# Altium footprint library NXP_60_26022015.PCBLIB: 287 footprints (part 4 of 18)
Each footprint in its own frame and in the unit in brackets; x right, y up, seen from the top. Pads: shape width x height; smd on the part's side, far side on the other; paste and mask are expansions set on the pad; w line width, h text height; cw(c..) or ccw(c..) is an arc to the next point about the centre after c.
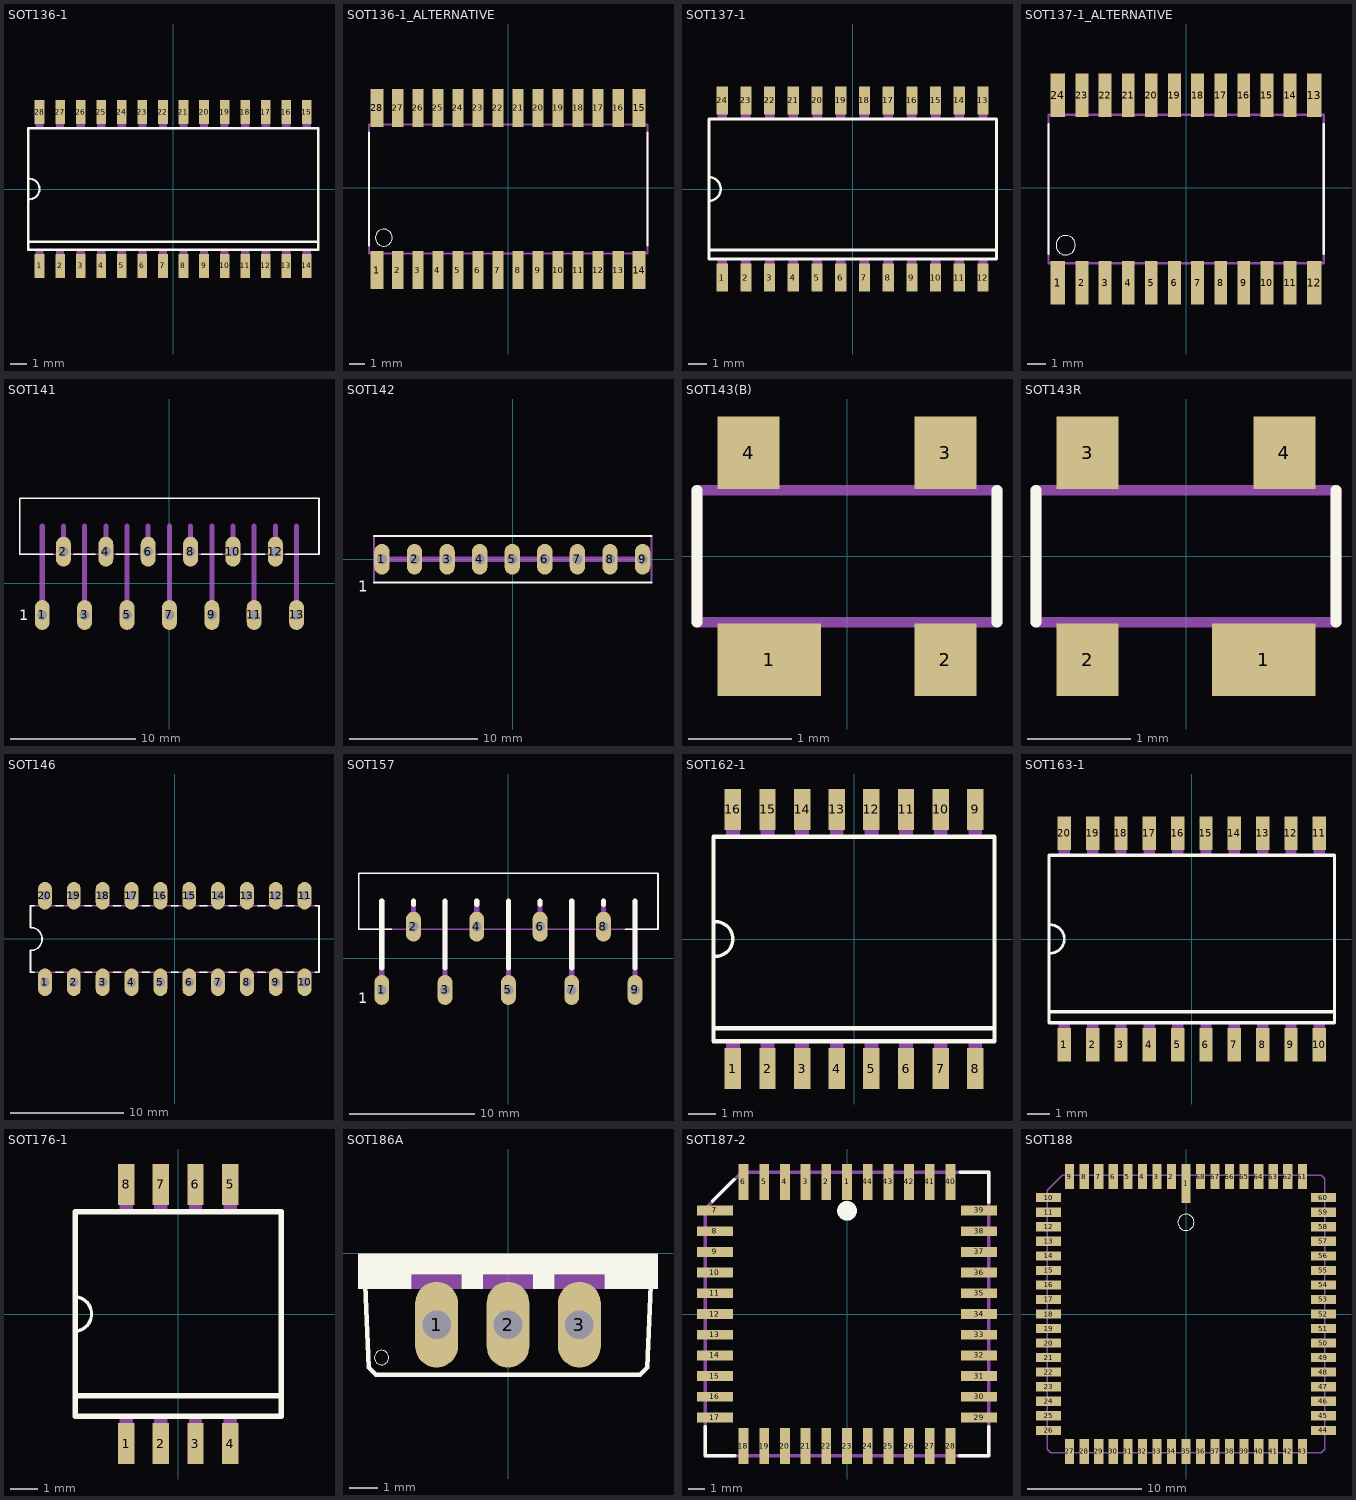
[diagram p3: the footprints below, top view; thin cyan lines are the x and y axes]

## SOT136-1 [mm]
pads (28):
  rect 0.6x1.5 smd: 1(-8.255,-4.75) 2(-6.985,-4.75) 3(-5.715,-4.75) 4(-4.445,-4.75) 5(-3.175,-4.75) 6(-1.905,-4.75) 7(-0.635,-4.75) 8(0.635,-4.75) 9(1.905,-4.75) 10(3.175,-4.75) 11(4.445,-4.75) 12(5.715,-4.75) 13(6.985,-4.75) 14(8.255,-4.75) 15(8.255,4.75) 16(6.985,4.75) 17(5.715,4.75) 18(4.445,4.75) 19(3.175,4.75) 20(1.905,4.75) 21(0.635,4.75) 22(-0.635,4.75) 23(-1.905,4.75) 24(-3.175,4.75) 25(-4.445,4.75) 26(-5.715,4.75) 27(-6.985,4.75) 28(-8.255,4.75)
Top Overlay:
  lines w0.127: -8.89,-0.635 ccw(c-8.89,0) -8.89,0.635
  lines w0.152: -8.95,-3.27 -8.95,3.75 8.95,3.75 8.95,-3.27 ; -8.95,-3.27 -8.95,-3.75 8.95,-3.75 8.95,-3.27 ; -8.95,-3.27 8.95,-3.27
Mechanical 16:
  rectangle: -0.889,3.75 -0.381,4.75
  rectangle: -2.159,3.75 -1.651,4.75
  rectangle: -3.429,3.75 -2.921,4.75
  rectangle: -4.699,3.75 -4.191,4.75
  rectangle: 0.381,3.75 0.889,4.75
  rectangle: 1.651,3.75 2.159,4.75
  rectangle: 2.921,3.75 3.429,4.75
  rectangle: 4.191,3.75 4.699,4.75
  rectangle: -0.889,-4.75 -0.381,-3.75
  rectangle: -2.159,-4.75 -1.651,-3.75
  rectangle: -3.429,-4.75 -2.921,-3.75
  rectangle: -4.699,-4.75 -4.191,-3.75
  rectangle: 0.381,-4.75 0.889,-3.75
  rectangle: 1.651,-4.75 2.159,-3.75
  rectangle: 2.921,-4.75 3.429,-3.75
  rectangle: 4.191,-4.75 4.699,-3.75
  rectangle: 5.461,3.75 5.969,4.75
  rectangle: -5.969,3.75 -5.461,4.75
  rectangle: 5.461,-4.75 5.969,-3.75
  rectangle: -5.969,-4.75 -5.461,-3.75
  rectangle: -7.239,3.75 -6.731,4.75
  rectangle: -8.509,3.75 -8.001,4.75
  rectangle: -7.239,-4.75 -6.731,-3.75
  rectangle: -8.509,-4.75 -8.001,-3.75
  rectangle: 6.731,-4.75 7.239,-3.75
  rectangle: 8.001,-4.75 8.509,-3.75
  rectangle: 6.731,3.75 7.239,4.75
  rectangle: 8.001,3.75 8.509,4.75

## SOT136-1_ALTERNATIVE [mil]
pads (28):
  rect 31.5x94.49 smd: 1(-326.97,-205) 14(326.97,-205) 15(326.97,200) 28(-326.97,200)
  rect 27.56x94.49 smd: 2(-275,-205) 3(-225,-205) 4(-175,-205) 5(-125,-205) 6(-75,-205) 7(-25,-205) 8(25,-205) 9(75,-205) 10(125,-205) 11(175,-205) 12(225,-205) 13(275,-205) 16(275,200) 17(225,200) 18(175,200) 19(125,200) 20(75,200) 21(25,200) 22(-25,200) 23(-75,200) 24(-125,200) 25(-175,200) 26(-225,200) 27(-275,200)
Top Overlay:
  circle w0: c-310,-124 r21
  lines w5: -347,-143 -347,138 ; 348,-143 348,138
Mechanical 16:
  rectangle: -335,-224 -315,-164
  rectangle: -285,-224 -265,-164
  rectangle: -235,-224 -215,-164
  rectangle: -185,-224 -165,-164
  rectangle: -135,-224 -115,-164
  rectangle: -85,-224 -65,-164
  rectangle: -35,-224 -15,-164
  rectangle: 15,-224 35,-164
  rectangle: 65,-224 85,-164
  rectangle: 115,-224 135,-164
  rectangle: 165,-224 185,-164
  rectangle: 215,-224 235,-164
  rectangle: 265,-224 285,-164
  rectangle: 315,-224 335,-164
  rectangle: 315,159 335,219
  rectangle: 265,159 285,219
  rectangle: 215,159 235,219
  rectangle: 165,159 185,219
  rectangle: 115,159 135,219
  rectangle: 65,159 85,219
  rectangle: 15,159 35,219
  rectangle: -35,159 -15,219
  rectangle: -85,159 -65,219
  rectangle: -135,159 -115,219
  rectangle: -185,159 -165,219
  rectangle: -235,159 -215,219
  rectangle: -285,159 -265,219
  rectangle: -335,159 -315,219
  lines w5: -347,-163 348,-163 348,158 -347,158 -347,-163

## SOT137-1 [mm]
pads (24):
  rect 0.6x1.5 smd: 1(-6.985,-4.75) 2(-5.715,-4.75) 3(-4.445,-4.75) 4(-3.175,-4.75) 5(-1.905,-4.75) 6(-0.635,-4.75) 7(0.635,-4.75) 8(1.905,-4.75) 9(3.175,-4.75) 10(4.445,-4.75) 11(5.715,-4.75) 12(6.985,-4.75) 13(6.985,4.75) 14(5.715,4.75) 15(4.445,4.75) 16(3.175,4.75) 17(1.905,4.75) 18(0.635,4.75) 19(-0.635,4.75) 20(-1.905,4.75) 21(-3.175,4.75) 22(-4.445,4.75) 23(-5.715,4.75) 24(-6.985,4.75)
Top Overlay:
  lines w0.127: -7.7,-0.635 ccw(c-7.7,0) -7.7,0.635
  lines w0.152: -7.7,-3.27 -7.7,-0.635 -7.7,0.635 -7.7,3.75 7.7,3.75 7.7,-3.27 ; -7.7,-3.27 -7.7,-3.75 7.7,-3.75 7.7,-3.27 ; -7.7,-3.27 7.7,-3.27
Mechanical 16:
  rectangle: -0.889,3.75 -0.381,4.75
  rectangle: -2.159,3.75 -1.651,4.75
  rectangle: -3.429,3.75 -2.921,4.75
  rectangle: -4.699,3.75 -4.191,4.75
  rectangle: 0.381,3.75 0.889,4.75
  rectangle: 1.651,3.75 2.159,4.75
  rectangle: 2.921,3.75 3.429,4.75
  rectangle: 4.191,3.75 4.699,4.75
  rectangle: -0.889,-4.75 -0.381,-3.75
  rectangle: -2.159,-4.75 -1.651,-3.75
  rectangle: -3.429,-4.75 -2.921,-3.75
  rectangle: -4.699,-4.75 -4.191,-3.75
  rectangle: 0.381,-4.75 0.889,-3.75
  rectangle: 1.651,-4.75 2.159,-3.75
  rectangle: 2.921,-4.75 3.429,-3.75
  rectangle: 4.191,-4.75 4.699,-3.75
  rectangle: 5.461,3.75 5.969,4.75
  rectangle: -5.969,3.75 -5.461,4.75
  rectangle: 5.461,-4.75 5.969,-3.75
  rectangle: -5.969,-4.75 -5.461,-3.75
  rectangle: -7.239,3.75 -6.731,4.75
  rectangle: -7.239,-4.75 -6.731,-3.75
  rectangle: 6.731,-4.75 7.239,-3.75
  rectangle: 6.731,3.75 7.239,4.75

## SOT137-1_ALTERNATIVE [mil]
pads (24):
  rect 31.5x94.49 smd: 1(-276.97,-205) 12(276.97,-205) 13(276.97,200) 24(-276.97,200)
  rect 27.56x94.49 smd: 2(-225,-205) 3(-175,-205) 4(-125,-205) 5(-75,-205) 6(-25,-205) 7(25,-205) 8(75,-205) 9(125,-205) 10(175,-205) 11(225,-205) 14(225,200) 15(175,200) 16(125,200) 17(75,200) 18(25,200) 19(-25,200) 20(-75,200) 21(-125,200) 22(-175,200) 23(-225,200)
Top Overlay:
  circle w0: c-260,-124 r21
  lines w5: -297,-143 -297,138 ; 298,-143 298,138
Mechanical 16:
  rectangle: -285,-224 -265,-164
  rectangle: -235,-224 -215,-164
  rectangle: -185,-224 -165,-164
  rectangle: -135,-224 -115,-164
  rectangle: -85,-224 -65,-164
  rectangle: -35,-224 -15,-164
  rectangle: 15,-224 35,-164
  rectangle: 65,-224 85,-164
  rectangle: 115,-224 135,-164
  rectangle: 165,-224 185,-164
  rectangle: 215,-224 235,-164
  rectangle: 265,-224 285,-164
  rectangle: 265,159 285,219
  rectangle: 215,159 235,219
  rectangle: 165,159 185,219
  rectangle: 115,159 135,219
  rectangle: 65,159 85,219
  rectangle: 15,159 35,219
  rectangle: -35,159 -15,219
  rectangle: -85,159 -65,219
  rectangle: -135,159 -115,219
  rectangle: -185,159 -165,219
  rectangle: -235,159 -215,219
  rectangle: -285,159 -265,219
  lines w5: -297,-163 298,-163 298,158 -297,158 -297,-163

## SOT141 [mil]
pads (13):
  oval 47.25x94.5 hole 31.5: 1(-401.57,-100) 2(-334.65,100) 3(-267.72,-100) 4(-200.79,100) 5(-133.86,-100) 6(-66.93,100) 7(0,-100) 8(66.93,100) 9(133.86,-100) 10(200.79,100) 11(267.72,-100) 12(334.65,100) 13(401.57,-100)
Top Overlay:
  lines w5: -368.11,92.13 -472.44,92.13 -472.44,269.29 472.44,269.29 472.44,92.13 368.11,92.13 ; -301.18,92.13 -234.25,92.13 ; -167.32,92.13 -100.39,92.13 ; -33.46,92.13 33.46,92.13 ; 100.39,92.13 167.32,92.13 ; 234.25,92.13 301.18,92.13
  text "1" at -475,-116.93 h33.46
Mechanical 16:
  lines w5: -472.44,92.13 472.44,92.13
  lines w16: -401.57,-100 -401.57,180.71 ; -334.65,100 -334.65,180.71 ; -267.72,-100 -267.72,180.71 ; -200.79,100 -200.79,180.71 ; -133.86,-100 -133.86,180.71 ; -66.93,100 -66.93,180.71 ; 0,-100 0,180.71 ; 66.93,100 66.93,180.71 ; 133.86,-100 133.86,180.71 ; 200.79,100 200.79,180.71 ; 267.72,-100 267.72,180.71 ; 334.65,100 334.65,180.71 ; 401.57,-100 401.57,180.71

## SOT142 [mil]
pads (9):
  oval 47.25x94.5 hole 31.5: 1(-401.57,0) 2(-301.57,0) 3(-201.57,0) 4(-101.57,0) 5(-1.57,0) 6(98.43,0) 7(198.43,0) 8(298.43,0) 9(398.43,0)
Top Overlay:
  lines w6: -425.2,-70.87 425.2,-70.87 ; -425.2,70.87 425.2,70.87
  text "1" at -475,-100 h33.46
Mechanical 16:
  lines w6: -425.2,-70.87 -425.2,70.87 ; 425.2,-70.87 425.2,70.87
  lines w16.54: -413.39,0 413.39,0

## SOT143(B) [mm]
pads (4):
  rect 1x0.7 smd: 1(-0.75,-1)
  rect 0.6x0.7 smd: 2(0.95,-1) 3(0.95,1) 4(-0.95,1)
Top Overlay:
  lines w0.102: -1.448,-0.635 -1.448,0.635 ; 1.448,-0.635 1.448,0.635
Mechanical 16:
  rectangle: 0.721,-1.293 1.179,-0.607
  rectangle: 0.721,0.607 1.179,1.293
  rectangle: -1.179,0.607 -0.721,1.293
  rectangle: -1.194,-1.321 -0.305,-0.635
  lines w0.102: -1.448,-0.635 1.448,-0.635 1.448,0.635 -1.448,0.635 -1.448,-0.635

## SOT143R [mm]
pads (4):
  rect 1x0.7 smd: 1(0.75,-1)
  rect 0.6x0.7 smd: 2(-0.95,-1) 3(-0.95,1) 4(0.95,1)
Top Overlay:
  lines w0.102: -1.448,-0.635 -1.448,0.635 ; 1.448,-0.635 1.448,0.635
Mechanical 16:
  rectangle: -1.179,-1.293 -0.721,-0.607
  rectangle: 0.721,0.607 1.179,1.293
  rectangle: -1.179,0.607 -0.721,1.293
  rectangle: 0.306,-1.321 1.195,-0.635
  lines w0.102: -1.448,-0.635 1.448,-0.635 1.448,0.635 -1.448,0.635 -1.448,-0.635

## SOT146 [mil]
pads (20):
  oval 48x96 hole 32: 1(-450,-150) 2(-350,-150) 3(-250,-150) 4(-150,-150) 5(-50,-150) 6(50,-150) 7(150,-150) 8(250,-150) 9(350,-150) 10(450,-150) 11(450,150) 12(350,150) 13(250,150) 14(150,150) 15(50,150) 16(-50,150) 17(-150,150) 18(-250,150) 19(-350,150) 20(-450,150)
Top Overlay:
  lines w6: -487.5,-115 -500,-115 -500,-40 ccw(c-500,0) -500,40 -500,115 -487.5,115 ; -412.5,-115 -387.5,-115 ; -412.5,115 -387.5,115 ; -312.5,-115 -287.5,-115 ; -312.5,115 -287.5,115 ; -212.5,-115 -187.5,-115 ; -212.5,115 -187.5,115 ; -112.5,-115 -87.5,-115 ; -112.5,115 -87.5,115 ; -12.5,-115 12.5,-115 ; -12.5,115 12.5,115 ; 87.5,-115 112.5,-115 ; 87.5,115 112.5,115 ; 187.5,-115 212.5,-115 ; 187.5,115 212.5,115 ; 287.5,-115 312.5,-115 ; 287.5,115 312.5,115 ; 387.5,-115 412.5,-115 ; 387.5,115 412.5,115 ; 487.5,-115 500,-115 500,115 487.5,115
Mechanical 16:
  lines w6: -500,-115 500,-115 ; -500,115 500,115

## SOT157 [mil]
pads (9):
  oval 47.25x94.5 hole 31.5: 1(-400,-100) 2(-300,100) 3(-200,-100) 4(-100,100) 5(0,-100) 6(100,100) 7(200,-100) 8(300,100) 9(400,-100)
Top Overlay:
  lines w5: -368.5,92.13 -472.44,92.13 -472.44,269.29 472.44,269.29 472.44,92.13 368.5,92.13
  lines w16: -400,-30 -400,180.71 ; -300,170 -300,180.71 ; -200,-30 -200,180.71 ; -100,170 -100,180.71 ; 0,-30 0,180.71 ; 100,170 100,180.71 ; 200,-30 200,180.71 ; 300,170 300,180.71 ; 400,-30 400,180.71
  text "1" at -475,-142.13 h33.46
Mechanical 16:
  lines w5: -472.44,92.13 472.44,92.13
  lines w16: -400,-100 -400,180.71 ; -300,100 -300,180.71 ; -200,-100 -200,180.71 ; -100,100 -100,180.71 ; 0,-100 0,180.71 ; 100,100 100,180.71 ; 200,-100 200,180.71 ; 300,100 300,180.71 ; 400,-100 400,180.71

## SOT162-1 [mm]
pads (16):
  rect 0.6x1.5 smd: 1(-4.445,-4.75) 2(-3.175,-4.75) 3(-1.905,-4.75) 4(-0.635,-4.75) 5(0.635,-4.75) 6(1.905,-4.75) 7(3.175,-4.75) 8(4.445,-4.75) 9(4.445,4.75) 10(3.175,4.75) 11(1.905,4.75) 12(0.635,4.75) 13(-0.635,4.75) 14(-1.905,4.75) 15(-3.175,4.75) 16(-4.445,4.75)
Top Overlay:
  lines w0.127: -5.08,-0.635 ccw(c-5.08,0) -5.08,0.635
  lines w0.152: -5.15,-3.27 -5.15,3.75 5.15,3.75 5.15,-3.27 ; -5.15,-3.27 -5.15,-3.75 5.15,-3.75 5.15,-3.27 ; -5.15,-3.27 5.15,-3.27
Mechanical 16:
  rectangle: -0.889,3.75 -0.381,4.75
  rectangle: -2.159,3.75 -1.651,4.75
  rectangle: -3.429,3.75 -2.921,4.75
  rectangle: -4.699,3.75 -4.191,4.75
  rectangle: 0.381,3.75 0.889,4.75
  rectangle: 1.651,3.75 2.159,4.75
  rectangle: 2.921,3.75 3.429,4.75
  rectangle: 4.191,3.75 4.699,4.75
  rectangle: -0.889,-4.75 -0.381,-3.75
  rectangle: -2.159,-4.75 -1.651,-3.75
  rectangle: -3.429,-4.75 -2.921,-3.75
  rectangle: -4.699,-4.75 -4.191,-3.75
  rectangle: 0.381,-4.75 0.889,-3.75
  rectangle: 1.651,-4.75 2.159,-3.75
  rectangle: 2.921,-4.75 3.429,-3.75
  rectangle: 4.191,-4.75 4.699,-3.75

## SOT163-1 [mm]
pads (20):
  rect 0.6x1.5 smd: 1(-5.715,-4.75) 2(-4.445,-4.75) 3(-3.175,-4.75) 4(-1.905,-4.75) 5(-0.635,-4.75) 6(0.635,-4.75) 7(1.905,-4.75) 8(3.175,-4.75) 9(4.445,-4.75) 10(5.715,-4.75) 11(5.715,4.75) 12(4.445,4.75) 13(3.175,4.75) 14(1.905,4.75) 15(0.635,4.75) 16(-0.635,4.75) 17(-1.905,4.75) 18(-3.175,4.75) 19(-4.445,4.75) 20(-5.715,4.75)
Top Overlay:
  lines w0.127: -6.35,-0.635 ccw(c-6.35,0) -6.35,0.635
  lines w0.152: -6.4,-3.27 -6.4,3.75 6.4,3.75 6.4,-3.27 ; -6.4,-3.27 -6.4,-3.75 6.4,-3.75 6.4,-3.27 ; -6.4,-3.27 6.4,-3.27
Mechanical 16:
  rectangle: -0.889,3.75 -0.381,4.75
  rectangle: -2.159,3.75 -1.651,4.75
  rectangle: -3.429,3.75 -2.921,4.75
  rectangle: -4.699,3.75 -4.191,4.75
  rectangle: 0.381,3.75 0.889,4.75
  rectangle: 1.651,3.75 2.159,4.75
  rectangle: 2.921,3.75 3.429,4.75
  rectangle: 4.191,3.75 4.699,4.75
  rectangle: -0.889,-4.75 -0.381,-3.75
  rectangle: -2.159,-4.75 -1.651,-3.75
  rectangle: -3.429,-4.75 -2.921,-3.75
  rectangle: -4.699,-4.75 -4.191,-3.75
  rectangle: 0.381,-4.75 0.889,-3.75
  rectangle: 1.651,-4.75 2.159,-3.75
  rectangle: 2.921,-4.75 3.429,-3.75
  rectangle: 4.191,-4.75 4.699,-3.75
  rectangle: 5.461,3.75 5.969,4.75
  rectangle: -5.969,3.75 -5.461,4.75
  rectangle: 5.461,-4.75 5.969,-3.75
  rectangle: -5.969,-4.75 -5.461,-3.75

## SOT176-1 [mm]
pads (8):
  rect 0.6x1.5 smd: 1(-1.905,-4.75) 2(-0.635,-4.75) 3(0.635,-4.75) 4(1.905,-4.75) 5(1.905,4.75) 6(0.635,4.75) 7(-0.635,4.75) 8(-1.905,4.75)
Top Overlay:
  lines w0.127: -3.81,-0.635 ccw(c-3.81,0) -3.81,0.635
  lines w0.203: -3.775,-3 -3.775,-3.75 3.775,-3.75 3.775,-3 ; -3.775,-3 -3.775,3.75 3.775,3.75 3.775,-3 ; -3.775,-3 3.775,-3
Mechanical 16:
  rectangle: -2.15,-4.85 -1.66,-3.75
  rectangle: -0.88,-4.85 -0.39,-3.75
  rectangle: 0.39,-4.85 0.88,-3.75
  rectangle: 1.66,-4.85 2.15,-3.75
  rectangle: 1.66,3.75 2.15,4.85
  rectangle: 0.39,3.75 0.88,4.85
  rectangle: -0.88,3.75 -0.39,4.85
  rectangle: -2.15,3.75 -1.66,4.85

## SOT186A [mil]
pads (3):
  oval 60x120 hole 40: 1(-100,-100) 2(0,-100) 3(100,-100)
Top Overlay:
  circle w0: c-177,-146 r10
  rectangle: -210,-30 210,0
  rectangle: -210,-50 -135,-30
  rectangle: -65,-50 -35,-30
  rectangle: 35,-50 65,-30
  rectangle: 135,-50 210,-30
  lines w6: -200,-45 -195,-160 -185,-170 185,-170 195,-160 200,-45
Mechanical 16:
  rectangle: -135,-50 -65,-30
  rectangle: -35,-50 35,-30
  rectangle: 65,-50 135,-30

## SOT187-2 [mm]
pads (44):
  rect 0.6x2.2 smd: 1(0,8.1) 2(-1.27,8.1) 3(-2.54,8.1) 4(-3.81,8.1) 5(-5.08,8.1) 6(-6.35,8.1) 18(-6.35,-8.1) 19(-5.08,-8.1) 20(-3.81,-8.1) 21(-2.54,-8.1) 22(-1.27,-8.1) 23(0,-8.1) 24(1.27,-8.1) 25(2.54,-8.1) 26(3.81,-8.1) 27(5.08,-8.1) 28(6.35,-8.1) 40(6.35,8.1) 41(5.08,8.1) 42(3.81,8.1) 43(2.54,8.1) 44(1.27,8.1)
  rect 2.2x0.6 smd: 7(-8.1,6.35) 8(-8.1,5.08) 9(-8.1,3.81) 10(-8.1,2.54) 11(-8.1,1.27) 12(-8.1,0) 13(-8.1,-1.27) 14(-8.1,-2.54) 15(-8.1,-3.81) 16(-8.1,-5.08) 17(-8.1,-6.35) 29(8.1,-6.35) 30(8.1,-5.08) 31(8.1,-3.81) 32(8.1,-2.54) 33(8.1,-1.27) 34(8.1,0) 35(8.1,1.27) 36(8.1,2.54) 37(8.1,3.81) 38(8.1,5.08) 39(8.1,6.35)
Top Overlay:
  circle w0.61: c0,6.33 r0.3
  lines w0.203: -8.687,-6.909 -8.687,-8.687 -6.883,-8.687 ; -8.255,6.909 -6.909,8.255 ; 6.883,-8.687 8.687,-8.687 8.687,-6.909 ; 6.934,8.687 8.687,8.687 8.687,6.858
Mechanical 16:
  rectangle: -0.26,8.75 0.26,9.2
  rectangle: -1.53,8.75 -1.01,9.2
  rectangle: -2.8,8.75 -2.28,9.2
  rectangle: -4.07,8.75 -3.55,9.2
  rectangle: -5.34,8.75 -4.82,9.2
  rectangle: -6.61,8.75 -6.09,9.2
  rectangle: -9.2,6.09 -8.75,6.61
  rectangle: -9.2,4.82 -8.75,5.34
  rectangle: -9.2,3.55 -8.75,4.07
  rectangle: -9.2,2.28 -8.75,2.8
  rectangle: -9.2,1.01 -8.75,1.53
  rectangle: -9.2,-0.26 -8.75,0.26
  rectangle: -9.2,-1.53 -8.75,-1.01
  rectangle: -9.2,-2.8 -8.75,-2.28
  rectangle: -9.2,-4.07 -8.75,-3.55
  rectangle: -9.2,-5.34 -8.75,-4.82
  rectangle: -9.2,-6.61 -8.75,-6.09
  rectangle: -6.61,-9.2 -6.09,-8.75
  rectangle: -5.34,-9.2 -4.82,-8.75
  rectangle: -4.07,-9.2 -3.55,-8.75
  rectangle: -2.8,-9.2 -2.28,-8.75
  rectangle: -1.53,-9.2 -1.01,-8.75
  rectangle: -0.26,-9.2 0.26,-8.75
  rectangle: 1.01,-9.2 1.53,-8.75
  rectangle: 2.28,-9.2 2.8,-8.75
  rectangle: 3.55,-9.2 4.07,-8.75
  rectangle: 4.82,-9.2 5.34,-8.75
  rectangle: 6.09,-9.2 6.61,-8.75
  rectangle: 8.75,-6.61 9.2,-6.09
  rectangle: 8.75,-5.34 9.2,-4.82
  rectangle: 8.75,-4.07 9.2,-3.55
  rectangle: 8.75,-2.8 9.2,-2.28
  rectangle: 8.75,-1.53 9.2,-1.01
  rectangle: 8.75,-0.26 9.2,0.26
  rectangle: 8.75,1.01 9.2,1.53
  rectangle: 8.75,2.28 9.2,2.8
  rectangle: 8.75,3.55 9.2,4.07
  rectangle: 8.75,4.82 9.2,5.34
  rectangle: 8.75,6.09 9.2,6.61
  rectangle: 6.09,8.75 6.61,9.2
  rectangle: 4.82,8.75 5.34,9.2
  rectangle: 3.55,8.75 4.07,9.2
  rectangle: 2.28,8.75 2.8,9.2
  rectangle: 1.01,8.75 1.53,9.2
  lines w0.203: -8.7,-8.7 -8.7,6.465 -6.465,8.7 8.7,8.7 8.7,-8.7 -8.7,-8.7

## SOT188 [mil]
pads (68):
  rect 31.5x133.86 smd: 1(0,448.82)
  rect 31.5x86.61 smd: 2(-50,472.44) 3(-100,472.44) 4(-150,472.44) 5(-200,472.44) 6(-250,472.44) 7(-300,472.44) 8(-350,472.44) 9(-400,472.44) 27(-400,-472.44) 28(-350,-472.44) 29(-300,-472.44) 30(-250,-472.44) 31(-200,-472.44) 32(-150,-472.44) 33(-100,-472.44) 34(-50,-472.44) 35(0,-472.44) 36(50,-472.44) 37(100,-472.44) 38(150,-472.44) 39(200,-472.44) 40(250,-472.44) 41(300,-472.44) 42(350,-472.44) 43(400,-472.44) 61(400,472.44) 62(350,472.44) 63(300,472.44) 64(250,472.44) 65(200,472.44) 66(150,472.44) 67(100,472.44) 68(50,472.44)
  rect 86.61x31.5 smd: 10(-472.44,400) 11(-472.44,350) 12(-472.44,300) 13(-472.44,250) 14(-472.44,200) 15(-472.44,150) 16(-472.44,100) 17(-472.44,50) 18(-472.44,0) 19(-472.44,-50) 20(-472.44,-100) 21(-472.44,-150) 22(-472.44,-200) 23(-472.44,-250) 24(-472.44,-300) 25(-472.44,-350) 26(-472.44,-400) 44(472.44,-400) 45(472.44,-350) 46(472.44,-300) 47(472.44,-250) 48(472.44,-200) 49(472.44,-150) 50(472.44,-100) 51(472.44,-50) 52(472.44,0) 53(472.44,50) 54(472.44,100) 55(472.44,150) 56(472.44,200) 57(472.44,250) 58(472.44,300) 59(472.44,350) 60(472.44,400)
Top Overlay:
  circle w0: c0,314.96 r27.84
Mechanical 16:
  rectangle: -13.78,476.38 13.78,494.09
  rectangle: 476.38,-13.78 494.09,13.78
  rectangle: -494.09,-13.78 -476.38,13.78
  rectangle: -13.78,-494.09 13.78,-476.38
  rectangle: -63.78,-494.09 -36.22,-476.38
  rectangle: -113.78,-494.09 -86.22,-476.38
  rectangle: -163.78,-494.09 -136.22,-476.38
  rectangle: -213.78,-494.09 -186.22,-476.38
  rectangle: -263.78,-494.09 -236.22,-476.38
  rectangle: -313.78,-494.09 -286.22,-476.38
  rectangle: -363.78,-494.09 -336.22,-476.38
  rectangle: -413.78,-494.09 -386.22,-476.38
  rectangle: 36.22,-494.09 63.78,-476.38
  rectangle: 86.22,-494.09 113.78,-476.38
  rectangle: 136.22,-494.09 163.78,-476.38
  rectangle: 186.22,-494.09 213.78,-476.38
  rectangle: 236.22,-494.09 263.78,-476.38
  rectangle: 286.22,-494.09 313.78,-476.38
  rectangle: 336.22,-494.09 363.78,-476.38
  rectangle: 386.22,-494.09 413.78,-476.38
  rectangle: 476.38,-63.78 494.09,-36.22
  rectangle: 476.38,-113.78 494.09,-86.22
  rectangle: 476.38,-163.78 494.09,-136.22
  rectangle: 476.38,-213.78 494.09,-186.22
  rectangle: 476.38,-263.78 494.09,-236.22
  rectangle: 476.38,-313.78 494.09,-286.22
  rectangle: 476.38,-363.78 494.09,-336.22
  rectangle: 476.38,-413.78 494.09,-386.22
  rectangle: 476.38,36.22 494.09,63.78
  rectangle: 476.38,86.22 494.09,113.78
  rectangle: 476.38,136.22 494.09,163.78
  rectangle: 476.38,186.22 494.09,213.78
  rectangle: 476.38,236.22 494.09,263.78
  rectangle: 476.38,286.22 494.09,313.78
  rectangle: 476.38,336.22 494.09,363.78
  rectangle: 476.38,386.22 494.09,413.78
  rectangle: -63.78,476.38 -36.22,494.09
  rectangle: -113.78,476.38 -86.22,494.09
  rectangle: -163.78,476.38 -136.22,494.09
  rectangle: -213.78,476.38 -186.22,494.09
  rectangle: -263.78,476.38 -236.22,494.09
  rectangle: -313.78,476.38 -286.22,494.09
  rectangle: -363.78,476.38 -336.22,494.09
  rectangle: -413.78,476.38 -386.22,494.09
  rectangle: 36.22,476.38 63.78,494.09
  rectangle: 86.22,476.38 113.78,494.09
  rectangle: 136.22,476.38 163.78,494.09
  rectangle: 186.22,476.38 213.78,494.09
  rectangle: 236.22,476.38 263.78,494.09
  rectangle: 286.22,476.38 313.78,494.09
  rectangle: 336.22,476.38 363.78,494.09
  rectangle: 386.22,476.38 413.78,494.09
  rectangle: -494.09,36.22 -476.38,63.78
  rectangle: -494.09,86.22 -476.38,113.78
  rectangle: -494.09,136.22 -476.38,163.78
  rectangle: -494.09,186.22 -476.38,213.78
  rectangle: -494.09,236.22 -476.38,263.78
  rectangle: -494.09,286.22 -476.38,313.78
  rectangle: -494.09,336.22 -476.38,363.78
  rectangle: -494.09,386.22 -476.38,413.78
  rectangle: -494.09,-63.78 -476.38,-36.22
  rectangle: -494.09,-113.78 -476.38,-86.22
  rectangle: -494.09,-163.78 -476.38,-136.22
  rectangle: -494.09,-213.78 -476.38,-186.22
  rectangle: -494.09,-263.78 -476.38,-236.22
  rectangle: -494.09,-313.78 -476.38,-286.22
  rectangle: -494.09,-363.78 -476.38,-336.22
  rectangle: -494.09,-413.78 -476.38,-386.22
  lines w5: -476.38,-464.57 -476.38,425.2 -425.2,476.38 464.57,476.38 476.38,464.57 476.38,-464.57 464.57,-476.38 -464.57,-476.38 -476.38,-464.57